# Altium footprint library Connector_Samtec_HLE_THT.PcbLib: 141 footprints (part 6 of 9)
Each footprint in its own frame and in the unit in brackets; x right, y up, seen from the top. Pads: shape width x height; smd on the part's side, far side on the other; paste and mask are expansions set on the pad; w line width, h text height; cw(c..) or ccw(c..) is an arc to the next point about the centre after c.
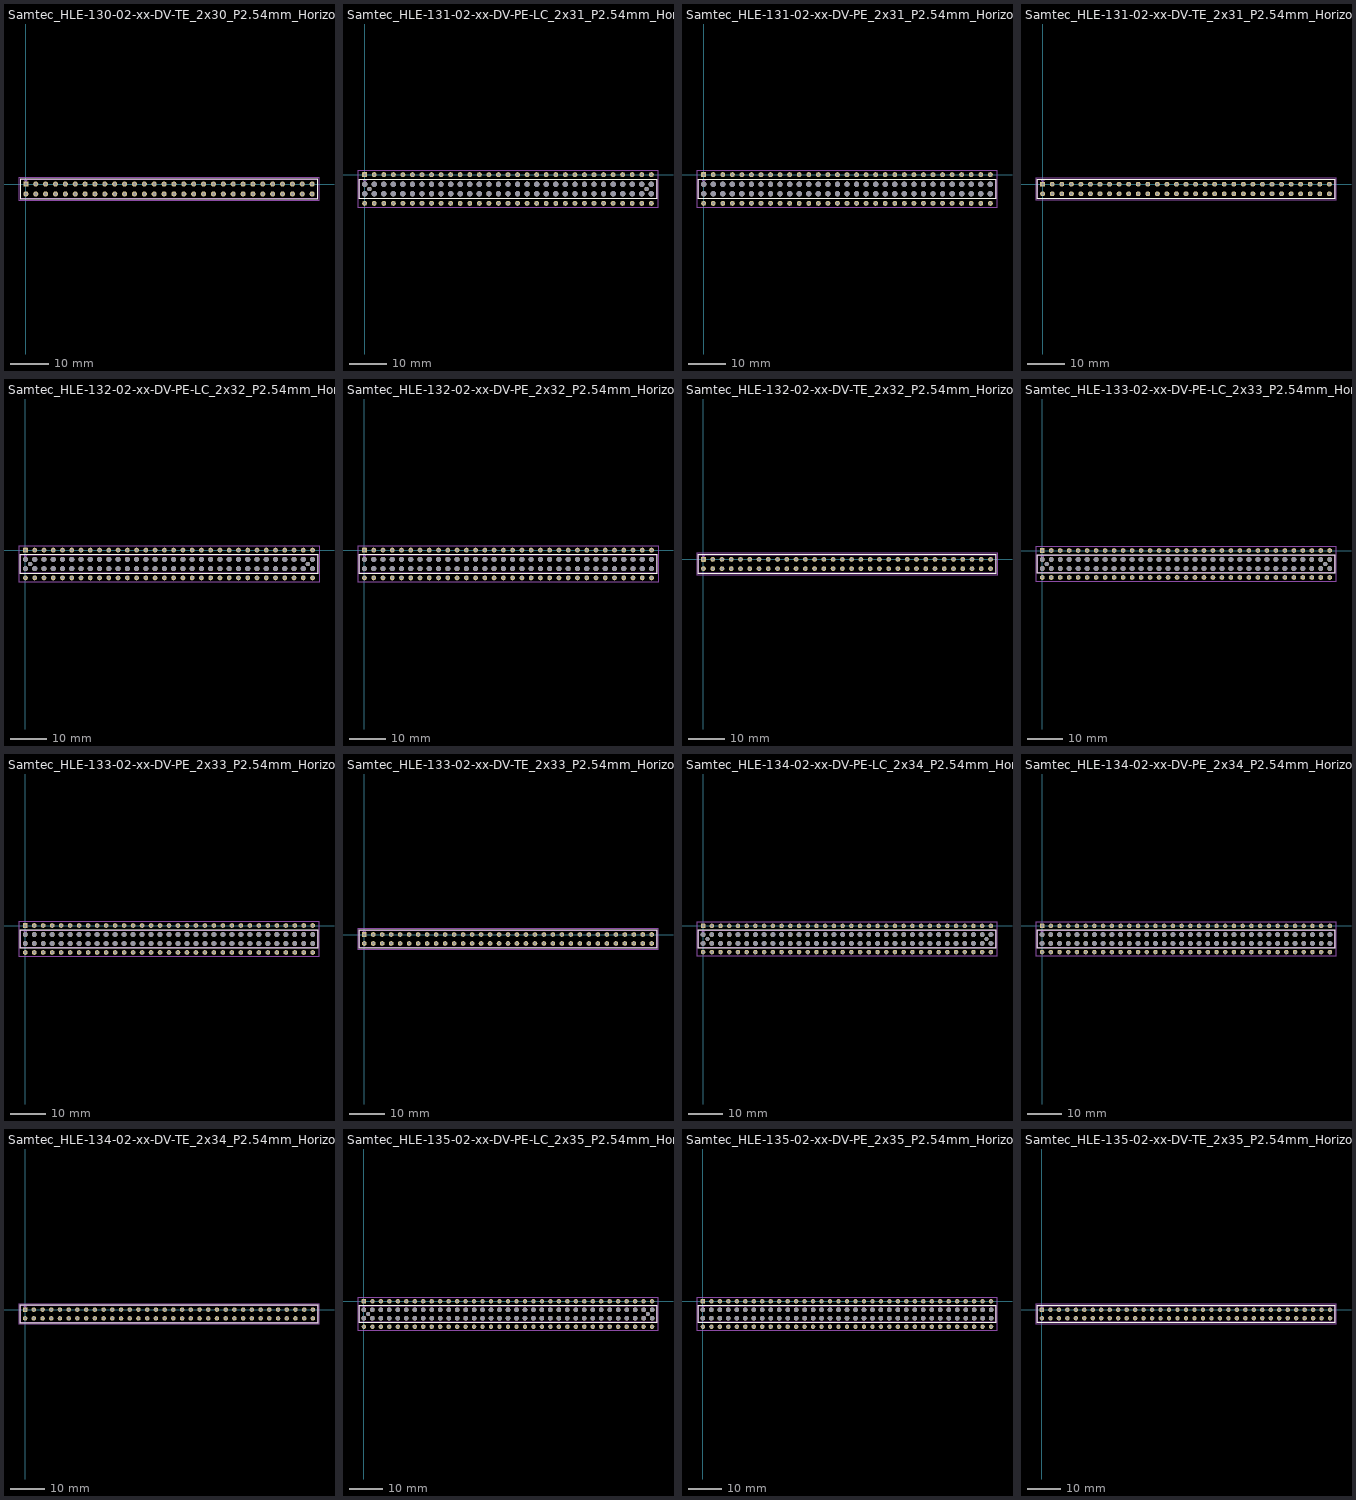
[diagram p5: the footprints below, top view; thin cyan lines are the x and y axes]

## Samtec_HLE-130-02-xx-DV-TE_2x30_P2.54mm_Horizontal [mm]
pads (60):
  rrect19% 1.31x1.31 hole 0.71: 1(0,0)
  round 1.31 hole 0.71: 2(0,-2.54) 3(2.54,0) 4(2.54,-2.54) 5(5.08,0) 6(5.08,-2.54) 7(7.62,0) 8(7.62,-2.54) 9(10.16,0) 10(10.16,-2.54) 11(12.7,0) 12(12.7,-2.54) 13(15.24,0) 14(15.24,-2.54) 15(17.78,0) 16(17.78,-2.54) 17(20.32,0) 18(20.32,-2.54) 19(22.86,0) 20(22.86,-2.54) 21(25.4,0) 22(25.4,-2.54) 23(27.94,0) 24(27.94,-2.54) 25(30.48,0) 26(30.48,-2.54) 27(33.02,0) 28(33.02,-2.54) 29(35.56,0) 30(35.56,-2.54) 31(38.1,0) 32(38.1,-2.54) 33(40.64,0) 34(40.64,-2.54) 35(43.18,0) 36(43.18,-2.54) 37(45.72,0) 38(45.72,-2.54) 39(48.26,0) 40(48.26,-2.54) 41(50.8,0) 42(50.8,-2.54) 43(53.34,0) 44(53.34,-2.54) 45(55.88,0) 46(55.88,-2.54) 47(58.42,0) 48(58.42,-2.54) 49(60.96,0) 50(60.96,-2.54) 51(63.5,0) 52(63.5,-2.54) 53(66.04,0) 54(66.04,-2.54) 55(68.58,0) 56(68.58,-2.54) 57(71.12,0) 58(71.12,-2.54) 59(73.66,0) 60(73.66,-2.54)
F.SilkS:
  lines w0.12: -1.38,-3.92 75.04,-3.92 75.04,1.38 -1.38,1.38 -1.38,-3.92
F.CrtYd:
  lines w0.05: -1.77,-4.31 75.43,-4.31 75.43,1.77 -1.77,1.77 -1.77,-4.31
F.Fab:
  lines w0.1: -0.5,1.27 0,0.563 0.5,1.27 ; -1.27,-3.81 -1.27,1.27 74.93,1.27 74.93,-3.81 -1.27,-3.81
  text "'.Designator'" at 32.783,-3.95 h1

## Samtec_HLE-131-02-xx-DV-PE-LC_2x31_P2.54mm_Horizontal [mm]
pads (126):
  rrect19% 1.31x1.31 hole 0.71: 1(0,0)
  round 1.31 hole 0.71: 2(0,-7.62) 3(2.54,0) 4(2.54,-7.62) 5(5.08,0) 6(5.08,-7.62) 7(7.62,0) 8(7.62,-7.62) 9(10.16,0) 10(10.16,-7.62) 11(12.7,0) 12(12.7,-7.62) 13(15.24,0) 14(15.24,-7.62) 15(17.78,0) 16(17.78,-7.62) 17(20.32,0) 18(20.32,-7.62) 19(22.86,0) 20(22.86,-7.62) 21(25.4,0) 22(25.4,-7.62) 23(27.94,0) 24(27.94,-7.62) 25(30.48,0) 26(30.48,-7.62) 27(33.02,0) 28(33.02,-7.62) 29(35.56,0) 30(35.56,-7.62) 31(38.1,0) 32(38.1,-7.62) 33(40.64,0) 34(40.64,-7.62) 35(43.18,0) 36(43.18,-7.62) 37(45.72,0) 38(45.72,-7.62) 39(48.26,0) 40(48.26,-7.62) 41(50.8,0) 42(50.8,-7.62) 43(53.34,0) 44(53.34,-7.62) 45(55.88,0) 46(55.88,-7.62) 47(58.42,0) 48(58.42,-7.62) 49(60.96,0) 50(60.96,-7.62) 51(63.5,0) 52(63.5,-7.62) 53(66.04,0) 54(66.04,-7.62) 55(68.58,0) 56(68.58,-7.62) 57(71.12,0) 58(71.12,-7.62) 59(73.66,0) 60(73.66,-7.62) 61(76.2,0) 62(76.2,-7.62)
  round 1.4 hole 1.4: Un1(55.88,-5.08) Un2(71.12,-2.54) Un3(12.7,-2.54) Un4(43.18,-2.54) Un5(35.56,-2.54) Un6(15.24,-5.08) Un7(68.58,-5.08) Un8(40.64,-5.08) Un9(17.78,-2.54) Un10(7.62,-5.08) Un11(10.16,-2.54) Un12(30.48,-2.54) Un13(27.94,-2.54) Un14(71.12,-5.08) Un15(50.8,-2.54) Un16(45.72,-2.54) Un17(40.64,-2.54) Un18(2.54,-2.54) Un19(5.08,-5.08) Un21(60.96,-5.08) Un22(73.66,-2.54) Un23(15.24,-2.54) Un24(63.5,-2.54) Un25(43.18,-5.08) Un26(45.72,-5.08) Un27(48.26,-2.54) Un28(76.2,-5.08) Un29(53.34,-5.08) Un30(20.32,-2.54) Un31(50.8,-5.08) Un32(20.32,-5.08) Un33(22.86,-2.54) Un34(55.88,-2.54) Un35(66.04,-2.54) Un36(17.78,-5.08) Un37(73.66,-5.08) Un38(58.42,-5.08) Un39(58.42,-2.54) Un40(66.04,-5.08) Un41(33.02,-2.54) Un42(12.7,-5.08) Un43(35.56,-5.08) Un44(60.96,-2.54) Un45(76.2,-2.54) Un46(68.58,-2.54) Un47(10.16,-5.08) Un48(2.54,-5.08) Un49(0,-2.54) Un50(63.5,-5.08) Un51(25.4,-2.54) Un52(25.4,-5.08) Un53(27.94,-5.08) Un54(30.48,-5.08) Un55(33.02,-5.08) Un56(53.34,-2.54) Un57(0,-5.08) Un58(7.62,-2.54) Un59(5.08,-2.54) Un60(38.1,-5.08) Un62(22.86,-5.08) Un63(38.1,-2.54) Un64(48.26,-5.08)
  round 1.19 hole 1.19: Un20(74.93,-3.81) Un61(1.27,-3.81)
F.SilkS:
  lines w0.12: -1.38,-6.46 -1.38,-1.16 77.58,-1.16 77.58,-6.46 -1.38,-6.46
F.CrtYd:
  lines w0.05: -1.77,-8.78 77.97,-8.78 77.97,1.16 -1.77,1.16 -1.77,-8.78
F.Fab:
  lines w0.1: -0.5,-1.27 0,-1.977 0.5,-1.27 ; -1.27,-6.35 77.47,-6.35 77.47,-1.27 -1.27,-1.27 -1.27,-6.35
  text "'.Designator'" at 34.053,-6.49 h1

## Samtec_HLE-131-02-xx-DV-PE_2x31_P2.54mm_Horizontal [mm]
pads (124):
  rrect19% 1.31x1.31 hole 0.71: 1(0,0)
  round 1.31 hole 0.71: 2(0,-7.62) 3(2.54,0) 4(2.54,-7.62) 5(5.08,0) 6(5.08,-7.62) 7(7.62,0) 8(7.62,-7.62) 9(10.16,0) 10(10.16,-7.62) 11(12.7,0) 12(12.7,-7.62) 13(15.24,0) 14(15.24,-7.62) 15(17.78,0) 16(17.78,-7.62) 17(20.32,0) 18(20.32,-7.62) 19(22.86,0) 20(22.86,-7.62) 21(25.4,0) 22(25.4,-7.62) 23(27.94,0) 24(27.94,-7.62) 25(30.48,0) 26(30.48,-7.62) 27(33.02,0) 28(33.02,-7.62) 29(35.56,0) 30(35.56,-7.62) 31(38.1,0) 32(38.1,-7.62) 33(40.64,0) 34(40.64,-7.62) 35(43.18,0) 36(43.18,-7.62) 37(45.72,0) 38(45.72,-7.62) 39(48.26,0) 40(48.26,-7.62) 41(50.8,0) 42(50.8,-7.62) 43(53.34,0) 44(53.34,-7.62) 45(55.88,0) 46(55.88,-7.62) 47(58.42,0) 48(58.42,-7.62) 49(60.96,0) 50(60.96,-7.62) 51(63.5,0) 52(63.5,-7.62) 53(66.04,0) 54(66.04,-7.62) 55(68.58,0) 56(68.58,-7.62) 57(71.12,0) 58(71.12,-7.62) 59(73.66,0) 60(73.66,-7.62) 61(76.2,0) 62(76.2,-7.62)
  round 1.4 hole 1.4: Un1(5.08,-2.54) Un2(60.96,-5.08) Un3(17.78,-2.54) Un4(48.26,-5.08) Un5(20.32,-2.54) Un6(27.94,-5.08) Un7(63.5,-5.08) Un8(15.24,-2.54) Un9(50.8,-5.08) Un10(15.24,-5.08) Un11(71.12,-2.54) Un12(76.2,-5.08) Un13(33.02,-2.54) Un14(33.02,-5.08) Un15(58.42,-2.54) Un16(66.04,-2.54) Un17(38.1,-2.54) Un18(73.66,-5.08) Un19(0,-5.08) Un20(10.16,-2.54) Un21(58.42,-5.08) Un22(50.8,-2.54) Un23(71.12,-5.08) Un24(53.34,-5.08) Un25(55.88,-5.08) Un26(43.18,-5.08) Un27(38.1,-5.08) Un28(63.5,-2.54) Un29(10.16,-5.08) Un30(60.96,-2.54) Un31(30.48,-2.54) Un32(48.26,-2.54) Un33(22.86,-5.08) Un34(20.32,-5.08) Un35(68.58,-2.54) Un36(66.04,-5.08) Un37(45.72,-2.54) Un38(76.2,-2.54) Un39(12.7,-2.54) Un40(25.4,-5.08) Un41(73.66,-2.54) Un42(40.64,-2.54) Un43(12.7,-5.08) Un44(27.94,-2.54) Un45(35.56,-5.08) Un46(2.54,-5.08) Un47(7.62,-5.08) Un48(45.72,-5.08) Un49(43.18,-2.54) Un50(17.78,-5.08) Un51(22.86,-2.54) Un52(53.34,-2.54) Un53(25.4,-2.54) Un54(5.08,-5.08) Un55(55.88,-2.54) Un56(30.48,-5.08) Un57(35.56,-2.54) Un58(2.54,-2.54) Un59(40.64,-5.08) Un60(68.58,-5.08) Un61(7.62,-2.54) Un62(0,-2.54)
F.SilkS:
  lines w0.12: -1.38,-6.46 -1.38,-1.16 77.58,-1.16 77.58,-6.46 -1.38,-6.46
F.CrtYd:
  lines w0.05: -1.77,-8.78 -1.77,1.16 77.97,1.16 77.97,-8.78 -1.77,-8.78
F.Fab:
  lines w0.1: -0.5,-1.27 0,-1.977 0.5,-1.27 ; -1.27,-6.35 77.47,-6.35 77.47,-1.27 -1.27,-1.27 -1.27,-6.35
  text "'.Designator'" at 34.053,-6.49 h1

## Samtec_HLE-131-02-xx-DV-TE_2x31_P2.54mm_Horizontal [mm]
pads (62):
  rrect19% 1.31x1.31 hole 0.71: 1(0,0)
  round 1.31 hole 0.71: 2(0,-2.54) 3(2.54,0) 4(2.54,-2.54) 5(5.08,0) 6(5.08,-2.54) 7(7.62,0) 8(7.62,-2.54) 9(10.16,0) 10(10.16,-2.54) 11(12.7,0) 12(12.7,-2.54) 13(15.24,0) 14(15.24,-2.54) 15(17.78,0) 16(17.78,-2.54) 17(20.32,0) 18(20.32,-2.54) 19(22.86,0) 20(22.86,-2.54) 21(25.4,0) 22(25.4,-2.54) 23(27.94,0) 24(27.94,-2.54) 25(30.48,0) 26(30.48,-2.54) 27(33.02,0) 28(33.02,-2.54) 29(35.56,0) 30(35.56,-2.54) 31(38.1,0) 32(38.1,-2.54) 33(40.64,0) 34(40.64,-2.54) 35(43.18,0) 36(43.18,-2.54) 37(45.72,0) 38(45.72,-2.54) 39(48.26,0) 40(48.26,-2.54) 41(50.8,0) 42(50.8,-2.54) 43(53.34,0) 44(53.34,-2.54) 45(55.88,0) 46(55.88,-2.54) 47(58.42,0) 48(58.42,-2.54) 49(60.96,0) 50(60.96,-2.54) 51(63.5,0) 52(63.5,-2.54) 53(66.04,0) 54(66.04,-2.54) 55(68.58,0) 56(68.58,-2.54) 57(71.12,0) 58(71.12,-2.54) 59(73.66,0) 60(73.66,-2.54) 61(76.2,0) 62(76.2,-2.54)
F.SilkS:
  lines w0.12: -1.38,-3.92 -1.38,1.38 77.58,1.38 77.58,-3.92 -1.38,-3.92
F.CrtYd:
  lines w0.05: -1.77,-4.31 77.97,-4.31 77.97,1.77 -1.77,1.77 -1.77,-4.31
F.Fab:
  lines w0.1: -0.5,1.27 0,0.563 0.5,1.27 ; -1.27,-3.81 77.47,-3.81 77.47,1.27 -1.27,1.27 -1.27,-3.81
  text "'.Designator'" at 34.053,-3.95 h1

## Samtec_HLE-132-02-xx-DV-PE-LC_2x32_P2.54mm_Horizontal [mm]
pads (130):
  rrect19% 1.31x1.31 hole 0.71: 1(0,0)
  round 1.31 hole 0.71: 2(0,-7.62) 3(2.54,0) 4(2.54,-7.62) 5(5.08,0) 6(5.08,-7.62) 7(7.62,0) 8(7.62,-7.62) 9(10.16,0) 10(10.16,-7.62) 11(12.7,0) 12(12.7,-7.62) 13(15.24,0) 14(15.24,-7.62) 15(17.78,0) 16(17.78,-7.62) 17(20.32,0) 18(20.32,-7.62) 19(22.86,0) 20(22.86,-7.62) 21(25.4,0) 22(25.4,-7.62) 23(27.94,0) 24(27.94,-7.62) 25(30.48,0) 26(30.48,-7.62) 27(33.02,0) 28(33.02,-7.62) 29(35.56,0) 30(35.56,-7.62) 31(38.1,0) 32(38.1,-7.62) 33(40.64,0) 34(40.64,-7.62) 35(43.18,0) 36(43.18,-7.62) 37(45.72,0) 38(45.72,-7.62) 39(48.26,0) 40(48.26,-7.62) 41(50.8,0) 42(50.8,-7.62) 43(53.34,0) 44(53.34,-7.62) 45(55.88,0) 46(55.88,-7.62) 47(58.42,0) 48(58.42,-7.62) 49(60.96,0) 50(60.96,-7.62) 51(63.5,0) 52(63.5,-7.62) 53(66.04,0) 54(66.04,-7.62) 55(68.58,0) 56(68.58,-7.62) 57(71.12,0) 58(71.12,-7.62) 59(73.66,0) 60(73.66,-7.62) 61(76.2,0) 62(76.2,-7.62) 63(78.74,0) 64(78.74,-7.62)
  round 1.4 hole 1.4: Un1(45.72,-5.08) Un2(10.16,-2.54) Un3(2.54,-5.08) Un4(30.48,-5.08) Un5(78.74,-2.54) Un6(66.04,-2.54) Un8(63.5,-2.54) Un9(35.56,-2.54) Un10(55.88,-2.54) Un11(38.1,-2.54) Un12(40.64,-2.54) Un13(5.08,-5.08) Un14(0,-2.54) Un15(25.4,-5.08) Un16(50.8,-5.08) Un17(20.32,-2.54) Un18(12.7,-2.54) Un19(55.88,-5.08) Un20(76.2,-5.08) Un21(48.26,-5.08) Un22(73.66,-5.08) Un23(15.24,-5.08) Un24(43.18,-5.08) Un25(25.4,-2.54) Un26(33.02,-5.08) Un27(43.18,-2.54) Un28(5.08,-2.54) Un29(17.78,-2.54) Un30(63.5,-5.08) Un31(33.02,-2.54) Un32(15.24,-2.54) Un33(58.42,-2.54) Un34(60.96,-5.08) Un35(2.54,-2.54) Un36(48.26,-2.54) Un37(22.86,-2.54) Un38(50.8,-2.54) Un40(60.96,-2.54) Un41(12.7,-5.08) Un42(7.62,-5.08) Un43(27.94,-2.54) Un44(22.86,-5.08) Un45(0,-5.08) Un46(53.34,-5.08) Un47(45.72,-2.54) Un48(53.34,-2.54) Un49(20.32,-5.08) Un50(71.12,-5.08) Un51(40.64,-5.08) Un52(71.12,-2.54) Un53(76.2,-2.54) Un54(35.56,-5.08) Un55(58.42,-5.08) Un56(68.58,-2.54) Un57(27.94,-5.08) Un58(68.58,-5.08) Un59(10.16,-5.08) Un60(17.78,-5.08) Un61(78.74,-5.08) Un62(38.1,-5.08) Un63(7.62,-2.54) Un64(73.66,-2.54) Un65(30.48,-2.54) Un66(66.04,-5.08)
  round 1.19 hole 1.19: Un7(1.27,-3.81) Un39(77.47,-3.81)
F.SilkS:
  lines w0.12: -1.38,-6.46 80.12,-6.46 80.12,-1.16 -1.38,-1.16 -1.38,-6.46
F.CrtYd:
  lines w0.05: -1.77,-8.78 -1.77,1.16 80.51,1.16 80.51,-8.78 -1.77,-8.78
F.Fab:
  lines w0.1: -0.5,-1.27 0,-1.977 0.5,-1.27 ; -1.27,-6.35 80.01,-6.35 80.01,-1.27 -1.27,-1.27 -1.27,-6.35
  text "'.Designator'" at 35.323,-6.49 h1

## Samtec_HLE-132-02-xx-DV-PE_2x32_P2.54mm_Horizontal [mm]
pads (128):
  rrect19% 1.31x1.31 hole 0.71: 1(0,0)
  round 1.31 hole 0.71: 2(0,-7.62) 3(2.54,0) 4(2.54,-7.62) 5(5.08,0) 6(5.08,-7.62) 7(7.62,0) 8(7.62,-7.62) 9(10.16,0) 10(10.16,-7.62) 11(12.7,0) 12(12.7,-7.62) 13(15.24,0) 14(15.24,-7.62) 15(17.78,0) 16(17.78,-7.62) 17(20.32,0) 18(20.32,-7.62) 19(22.86,0) 20(22.86,-7.62) 21(25.4,0) 22(25.4,-7.62) 23(27.94,0) 24(27.94,-7.62) 25(30.48,0) 26(30.48,-7.62) 27(33.02,0) 28(33.02,-7.62) 29(35.56,0) 30(35.56,-7.62) 31(38.1,0) 32(38.1,-7.62) 33(40.64,0) 34(40.64,-7.62) 35(43.18,0) 36(43.18,-7.62) 37(45.72,0) 38(45.72,-7.62) 39(48.26,0) 40(48.26,-7.62) 41(50.8,0) 42(50.8,-7.62) 43(53.34,0) 44(53.34,-7.62) 45(55.88,0) 46(55.88,-7.62) 47(58.42,0) 48(58.42,-7.62) 49(60.96,0) 50(60.96,-7.62) 51(63.5,0) 52(63.5,-7.62) 53(66.04,0) 54(66.04,-7.62) 55(68.58,0) 56(68.58,-7.62) 57(71.12,0) 58(71.12,-7.62) 59(73.66,0) 60(73.66,-7.62) 61(76.2,0) 62(76.2,-7.62) 63(78.74,0) 64(78.74,-7.62)
  round 1.4 hole 1.4: Un1(48.26,-5.08) Un2(60.96,-2.54) Un3(5.08,-5.08) Un4(63.5,-5.08) Un5(71.12,-5.08) Un6(0,-5.08) Un7(2.54,-2.54) Un8(12.7,-2.54) Un9(40.64,-5.08) Un10(22.86,-5.08) Un11(63.5,-2.54) Un12(10.16,-2.54) Un13(71.12,-2.54) Un14(48.26,-2.54) Un15(33.02,-5.08) Un16(25.4,-5.08) Un17(15.24,-5.08) Un18(0,-2.54) Un19(33.02,-2.54) Un20(58.42,-5.08) Un21(55.88,-2.54) Un22(66.04,-2.54) Un23(76.2,-5.08) Un24(45.72,-2.54) Un25(68.58,-5.08) Un26(30.48,-2.54) Un27(17.78,-5.08) Un28(30.48,-5.08) Un29(50.8,-5.08) Un30(76.2,-2.54) Un31(7.62,-2.54) Un32(60.96,-5.08) Un33(53.34,-2.54) Un34(53.34,-5.08) Un35(66.04,-5.08) Un36(10.16,-5.08) Un37(38.1,-2.54) Un38(22.86,-2.54) Un39(43.18,-2.54) Un40(2.54,-5.08) Un41(38.1,-5.08) Un42(78.74,-5.08) Un43(20.32,-5.08) Un44(50.8,-2.54) Un45(78.74,-2.54) Un46(40.64,-2.54) Un47(15.24,-2.54) Un48(58.42,-2.54) Un49(35.56,-5.08) Un50(7.62,-5.08) Un51(12.7,-5.08) Un52(20.32,-2.54) Un53(73.66,-5.08) Un54(68.58,-2.54) Un55(35.56,-2.54) Un56(25.4,-2.54) Un57(73.66,-2.54) Un58(43.18,-5.08) Un59(27.94,-2.54) Un60(55.88,-5.08) Un61(5.08,-2.54) Un62(45.72,-5.08) Un63(17.78,-2.54) Un64(27.94,-5.08)
F.SilkS:
  lines w0.12: -1.38,-6.46 80.12,-6.46 80.12,-1.16 -1.38,-1.16 -1.38,-6.46
F.CrtYd:
  lines w0.05: -1.77,-8.78 80.51,-8.78 80.51,1.16 -1.77,1.16 -1.77,-8.78
F.Fab:
  lines w0.1: -0.5,-1.27 0,-1.977 0.5,-1.27 ; -1.27,-6.35 80.01,-6.35 80.01,-1.27 -1.27,-1.27 -1.27,-6.35
  text "'.Designator'" at 35.323,-6.49 h1

## Samtec_HLE-132-02-xx-DV-TE_2x32_P2.54mm_Horizontal [mm]
pads (64):
  rrect19% 1.31x1.31 hole 0.71: 1(0,0)
  round 1.31 hole 0.71: 2(0,-2.54) 3(2.54,0) 4(2.54,-2.54) 5(5.08,0) 6(5.08,-2.54) 7(7.62,0) 8(7.62,-2.54) 9(10.16,0) 10(10.16,-2.54) 11(12.7,0) 12(12.7,-2.54) 13(15.24,0) 14(15.24,-2.54) 15(17.78,0) 16(17.78,-2.54) 17(20.32,0) 18(20.32,-2.54) 19(22.86,0) 20(22.86,-2.54) 21(25.4,0) 22(25.4,-2.54) 23(27.94,0) 24(27.94,-2.54) 25(30.48,0) 26(30.48,-2.54) 27(33.02,0) 28(33.02,-2.54) 29(35.56,0) 30(35.56,-2.54) 31(38.1,0) 32(38.1,-2.54) 33(40.64,0) 34(40.64,-2.54) 35(43.18,0) 36(43.18,-2.54) 37(45.72,0) 38(45.72,-2.54) 39(48.26,0) 40(48.26,-2.54) 41(50.8,0) 42(50.8,-2.54) 43(53.34,0) 44(53.34,-2.54) 45(55.88,0) 46(55.88,-2.54) 47(58.42,0) 48(58.42,-2.54) 49(60.96,0) 50(60.96,-2.54) 51(63.5,0) 52(63.5,-2.54) 53(66.04,0) 54(66.04,-2.54) 55(68.58,0) 56(68.58,-2.54) 57(71.12,0) 58(71.12,-2.54) 59(73.66,0) 60(73.66,-2.54) 61(76.2,0) 62(76.2,-2.54) 63(78.74,0) 64(78.74,-2.54)
F.SilkS:
  lines w0.12: -1.38,-3.92 80.12,-3.92 80.12,1.38 -1.38,1.38 -1.38,-3.92
F.CrtYd:
  lines w0.05: -1.77,-4.31 -1.77,1.77 80.51,1.77 80.51,-4.31 -1.77,-4.31
F.Fab:
  lines w0.1: -0.5,1.27 0,0.563 0.5,1.27 ; -1.27,-3.81 80.01,-3.81 80.01,1.27 -1.27,1.27 -1.27,-3.81
  text "'.Designator'" at 35.323,-3.95 h1

## Samtec_HLE-133-02-xx-DV-PE-LC_2x33_P2.54mm_Horizontal [mm]
pads (134):
  rrect19% 1.31x1.31 hole 0.71: 1(0,0)
  round 1.31 hole 0.71: 2(0,-7.62) 3(2.54,0) 4(2.54,-7.62) 5(5.08,0) 6(5.08,-7.62) 7(7.62,0) 8(7.62,-7.62) 9(10.16,0) 10(10.16,-7.62) 11(12.7,0) 12(12.7,-7.62) 13(15.24,0) 14(15.24,-7.62) 15(17.78,0) 16(17.78,-7.62) 17(20.32,0) 18(20.32,-7.62) 19(22.86,0) 20(22.86,-7.62) 21(25.4,0) 22(25.4,-7.62) 23(27.94,0) 24(27.94,-7.62) 25(30.48,0) 26(30.48,-7.62) 27(33.02,0) 28(33.02,-7.62) 29(35.56,0) 30(35.56,-7.62) 31(38.1,0) 32(38.1,-7.62) 33(40.64,0) 34(40.64,-7.62) 35(43.18,0) 36(43.18,-7.62) 37(45.72,0) 38(45.72,-7.62) 39(48.26,0) 40(48.26,-7.62) 41(50.8,0) 42(50.8,-7.62) 43(53.34,0) 44(53.34,-7.62) 45(55.88,0) 46(55.88,-7.62) 47(58.42,0) 48(58.42,-7.62) 49(60.96,0) 50(60.96,-7.62) 51(63.5,0) 52(63.5,-7.62) 53(66.04,0) 54(66.04,-7.62) 55(68.58,0) 56(68.58,-7.62) 57(71.12,0) 58(71.12,-7.62) 59(73.66,0) 60(73.66,-7.62) 61(76.2,0) 62(76.2,-7.62) 63(78.74,0) 64(78.74,-7.62) 65(81.28,0) 66(81.28,-7.62)
  round 1.4 hole 1.4: Un1(73.66,-2.54) Un2(63.5,-2.54) Un3(43.18,-5.08) Un4(68.58,-2.54) Un5(40.64,-2.54) Un6(20.32,-5.08) Un7(68.58,-5.08) Un8(58.42,-5.08) Un9(35.56,-2.54) Un10(63.5,-5.08) Un11(7.62,-2.54) Un12(10.16,-5.08) Un13(53.34,-5.08) Un14(53.34,-2.54) Un15(7.62,-5.08) Un16(50.8,-5.08) Un17(25.4,-5.08) Un18(71.12,-5.08) Un19(15.24,-5.08) Un20(33.02,-2.54) Un21(30.48,-2.54) Un23(20.32,-2.54) Un24(17.78,-5.08) Un25(71.12,-2.54) Un26(5.08,-5.08) Un27(73.66,-5.08) Un28(5.08,-2.54) Un29(81.28,-5.08) Un30(27.94,-2.54) Un31(81.28,-2.54) Un32(33.02,-5.08) Un33(35.56,-5.08) Un34(0,-2.54) Un35(12.7,-5.08) Un36(55.88,-5.08) Un37(17.78,-2.54) Un38(78.74,-5.08) Un39(27.94,-5.08) Un40(60.96,-2.54) Un41(76.2,-2.54) Un42(12.7,-2.54) Un43(60.96,-5.08) Un44(50.8,-2.54) Un45(55.88,-2.54) Un46(45.72,-2.54) Un48(15.24,-2.54) Un49(66.04,-2.54) Un50(2.54,-2.54) Un51(40.64,-5.08) Un52(30.48,-5.08) Un53(48.26,-5.08) Un54(25.4,-2.54) Un55(38.1,-5.08) Un56(58.42,-2.54) Un57(10.16,-2.54) Un58(45.72,-5.08) Un59(0,-5.08) Un60(2.54,-5.08) Un61(48.26,-2.54) Un62(38.1,-2.54) Un63(22.86,-2.54) Un64(78.74,-2.54) Un65(22.86,-5.08) Un66(66.04,-5.08) Un67(76.2,-5.08) Un68(43.18,-2.54)
  round 1.19 hole 1.19: Un22(80.01,-3.81) Un47(1.27,-3.81)
F.SilkS:
  lines w0.12: -1.38,-6.46 82.66,-6.46 82.66,-1.16 -1.38,-1.16 -1.38,-6.46
F.CrtYd:
  lines w0.05: -1.77,-8.78 83.05,-8.78 83.05,1.16 -1.77,1.16 -1.77,-8.78
F.Fab:
  lines w0.1: -0.5,-1.27 0,-1.977 0.5,-1.27 ; -1.27,-6.35 82.55,-6.35 82.55,-1.27 -1.27,-1.27 -1.27,-6.35
  text "'.Designator'" at 36.593,-6.49 h1

## Samtec_HLE-133-02-xx-DV-PE_2x33_P2.54mm_Horizontal [mm]
pads (132):
  rrect19% 1.31x1.31 hole 0.71: 1(0,0)
  round 1.31 hole 0.71: 2(0,-7.62) 3(2.54,0) 4(2.54,-7.62) 5(5.08,0) 6(5.08,-7.62) 7(7.62,0) 8(7.62,-7.62) 9(10.16,0) 10(10.16,-7.62) 11(12.7,0) 12(12.7,-7.62) 13(15.24,0) 14(15.24,-7.62) 15(17.78,0) 16(17.78,-7.62) 17(20.32,0) 18(20.32,-7.62) 19(22.86,0) 20(22.86,-7.62) 21(25.4,0) 22(25.4,-7.62) 23(27.94,0) 24(27.94,-7.62) 25(30.48,0) 26(30.48,-7.62) 27(33.02,0) 28(33.02,-7.62) 29(35.56,0) 30(35.56,-7.62) 31(38.1,0) 32(38.1,-7.62) 33(40.64,0) 34(40.64,-7.62) 35(43.18,0) 36(43.18,-7.62) 37(45.72,0) 38(45.72,-7.62) 39(48.26,0) 40(48.26,-7.62) 41(50.8,0) 42(50.8,-7.62) 43(53.34,0) 44(53.34,-7.62) 45(55.88,0) 46(55.88,-7.62) 47(58.42,0) 48(58.42,-7.62) 49(60.96,0) 50(60.96,-7.62) 51(63.5,0) 52(63.5,-7.62) 53(66.04,0) 54(66.04,-7.62) 55(68.58,0) 56(68.58,-7.62) 57(71.12,0) 58(71.12,-7.62) 59(73.66,0) 60(73.66,-7.62) 61(76.2,0) 62(76.2,-7.62) 63(78.74,0) 64(78.74,-7.62) 65(81.28,0) 66(81.28,-7.62)
  round 1.4 hole 1.4: Un1(68.58,-5.08) Un2(76.2,-2.54) Un3(38.1,-5.08) Un4(55.88,-5.08) Un5(71.12,-5.08) Un6(55.88,-2.54) Un7(50.8,-2.54) Un8(0,-2.54) Un9(30.48,-2.54) Un10(0,-5.08) Un11(66.04,-5.08) Un12(48.26,-5.08) Un13(20.32,-2.54) Un14(12.7,-2.54) Un15(35.56,-2.54) Un16(73.66,-5.08) Un17(53.34,-2.54) Un18(48.26,-2.54) Un19(25.4,-5.08) Un20(20.32,-5.08) Un21(27.94,-5.08) Un22(58.42,-2.54) Un23(15.24,-5.08) Un24(43.18,-2.54) Un25(17.78,-5.08) Un26(60.96,-5.08) Un27(71.12,-2.54) Un28(66.04,-2.54) Un29(33.02,-2.54) Un30(53.34,-5.08) Un31(81.28,-2.54) Un32(40.64,-2.54) Un33(81.28,-5.08) Un34(27.94,-2.54) Un35(7.62,-5.08) Un36(63.5,-5.08) Un37(17.78,-2.54) Un38(68.58,-2.54) Un39(30.48,-5.08) Un40(12.7,-5.08) Un41(35.56,-5.08) Un42(7.62,-2.54) Un43(38.1,-2.54) Un44(22.86,-5.08) Un45(40.64,-5.08) Un46(2.54,-2.54) Un47(43.18,-5.08) Un48(10.16,-2.54) Un49(73.66,-2.54) Un50(33.02,-5.08) Un51(22.86,-2.54) Un52(45.72,-5.08) Un53(78.74,-5.08) Un54(78.74,-2.54) Un55(60.96,-2.54) Un56(5.08,-2.54) Un57(58.42,-5.08) Un58(45.72,-2.54) Un59(10.16,-5.08) Un60(15.24,-2.54) Un61(25.4,-2.54) Un62(63.5,-2.54) Un63(76.2,-5.08) Un64(5.08,-5.08) Un65(2.54,-5.08) Un66(50.8,-5.08)
F.SilkS:
  lines w0.12: -1.38,-6.46 -1.38,-1.16 82.66,-1.16 82.66,-6.46 -1.38,-6.46
F.CrtYd:
  lines w0.05: -1.77,-8.78 -1.77,1.16 83.05,1.16 83.05,-8.78 -1.77,-8.78
F.Fab:
  lines w0.1: -0.5,-1.27 0,-1.977 0.5,-1.27 ; -1.27,-6.35 -1.27,-1.27 82.55,-1.27 82.55,-6.35 -1.27,-6.35
  text "'.Designator'" at 36.593,-6.49 h1

## Samtec_HLE-133-02-xx-DV-TE_2x33_P2.54mm_Horizontal [mm]
pads (66):
  rrect19% 1.31x1.31 hole 0.71: 1(0,0)
  round 1.31 hole 0.71: 2(0,-2.54) 3(2.54,0) 4(2.54,-2.54) 5(5.08,0) 6(5.08,-2.54) 7(7.62,0) 8(7.62,-2.54) 9(10.16,0) 10(10.16,-2.54) 11(12.7,0) 12(12.7,-2.54) 13(15.24,0) 14(15.24,-2.54) 15(17.78,0) 16(17.78,-2.54) 17(20.32,0) 18(20.32,-2.54) 19(22.86,0) 20(22.86,-2.54) 21(25.4,0) 22(25.4,-2.54) 23(27.94,0) 24(27.94,-2.54) 25(30.48,0) 26(30.48,-2.54) 27(33.02,0) 28(33.02,-2.54) 29(35.56,0) 30(35.56,-2.54) 31(38.1,0) 32(38.1,-2.54) 33(40.64,0) 34(40.64,-2.54) 35(43.18,0) 36(43.18,-2.54) 37(45.72,0) 38(45.72,-2.54) 39(48.26,0) 40(48.26,-2.54) 41(50.8,0) 42(50.8,-2.54) 43(53.34,0) 44(53.34,-2.54) 45(55.88,0) 46(55.88,-2.54) 47(58.42,0) 48(58.42,-2.54) 49(60.96,0) 50(60.96,-2.54) 51(63.5,0) 52(63.5,-2.54) 53(66.04,0) 54(66.04,-2.54) 55(68.58,0) 56(68.58,-2.54) 57(71.12,0) 58(71.12,-2.54) 59(73.66,0) 60(73.66,-2.54) 61(76.2,0) 62(76.2,-2.54) 63(78.74,0) 64(78.74,-2.54) 65(81.28,0) 66(81.28,-2.54)
F.SilkS:
  lines w0.12: -1.38,-3.92 82.66,-3.92 82.66,1.38 -1.38,1.38 -1.38,-3.92
F.CrtYd:
  lines w0.05: -1.77,-4.31 83.05,-4.31 83.05,1.77 -1.77,1.77 -1.77,-4.31
F.Fab:
  lines w0.1: -0.5,1.27 0,0.563 0.5,1.27 ; -1.27,-3.81 -1.27,1.27 82.55,1.27 82.55,-3.81 -1.27,-3.81
  text "'.Designator'" at 36.593,-3.95 h1

## Samtec_HLE-134-02-xx-DV-PE-LC_2x34_P2.54mm_Horizontal [mm]
pads (138):
  rrect19% 1.31x1.31 hole 0.71: 1(0,0)
  round 1.31 hole 0.71: 2(0,-7.62) 3(2.54,0) 4(2.54,-7.62) 5(5.08,0) 6(5.08,-7.62) 7(7.62,0) 8(7.62,-7.62) 9(10.16,0) 10(10.16,-7.62) 11(12.7,0) 12(12.7,-7.62) 13(15.24,0) 14(15.24,-7.62) 15(17.78,0) 16(17.78,-7.62) 17(20.32,0) 18(20.32,-7.62) 19(22.86,0) 20(22.86,-7.62) 21(25.4,0) 22(25.4,-7.62) 23(27.94,0) 24(27.94,-7.62) 25(30.48,0) 26(30.48,-7.62) 27(33.02,0) 28(33.02,-7.62) 29(35.56,0) 30(35.56,-7.62) 31(38.1,0) 32(38.1,-7.62) 33(40.64,0) 34(40.64,-7.62) 35(43.18,0) 36(43.18,-7.62) 37(45.72,0) 38(45.72,-7.62) 39(48.26,0) 40(48.26,-7.62) 41(50.8,0) 42(50.8,-7.62) 43(53.34,0) 44(53.34,-7.62) 45(55.88,0) 46(55.88,-7.62) 47(58.42,0) 48(58.42,-7.62) 49(60.96,0) 50(60.96,-7.62) 51(63.5,0) 52(63.5,-7.62) 53(66.04,0) 54(66.04,-7.62) 55(68.58,0) 56(68.58,-7.62) 57(71.12,0) 58(71.12,-7.62) 59(73.66,0) 60(73.66,-7.62) 61(76.2,0) 62(76.2,-7.62) 63(78.74,0) 64(78.74,-7.62) 65(81.28,0) 66(81.28,-7.62) 67(83.82,0) 68(83.82,-7.62)
  round 1.4 hole 1.4: Un1(20.32,-5.08) Un2(50.8,-2.54) Un3(7.62,-5.08) Un4(2.54,-2.54) Un5(76.2,-5.08) Un6(7.62,-2.54) Un7(15.24,-5.08) Un8(83.82,-5.08) Un9(66.04,-5.08) Un10(55.88,-2.54) Un11(30.48,-2.54) Un12(45.72,-5.08) Un13(30.48,-5.08) Un14(17.78,-2.54) Un15(12.7,-5.08) Un16(63.5,-5.08) Un17(17.78,-5.08) Un18(10.16,-5.08) Un19(78.74,-5.08) Un20(50.8,-5.08) Un22(38.1,-2.54) Un23(53.34,-5.08) Un24(83.82,-2.54) Un25(71.12,-2.54) Un26(25.4,-2.54) Un27(38.1,-5.08) Un28(53.34,-2.54) Un29(81.28,-5.08) Un30(12.7,-2.54) Un31(22.86,-5.08) Un32(58.42,-5.08) Un33(27.94,-2.54) Un34(40.64,-5.08) Un35(48.26,-2.54) Un36(63.5,-2.54) Un37(0,-5.08) Un38(60.96,-2.54) Un39(27.94,-5.08) Un40(58.42,-2.54) Un41(71.12,-5.08) Un42(15.24,-2.54) Un43(76.2,-2.54) Un44(2.54,-5.08) Un45(55.88,-5.08) Un46(22.86,-2.54) Un48(48.26,-5.08) Un49(66.04,-2.54) Un50(68.58,-2.54) Un51(68.58,-5.08) Un52(73.66,-5.08) Un53(78.74,-2.54) Un54(5.08,-2.54) Un55(45.72,-2.54) Un56(43.18,-5.08) Un57(73.66,-2.54) Un58(35.56,-2.54) Un59(40.64,-2.54) Un60(25.4,-5.08) Un61(81.28,-2.54) Un62(35.56,-5.08) Un63(10.16,-2.54) Un64(60.96,-5.08) Un65(33.02,-2.54) Un66(43.18,-2.54) Un67(5.08,-5.08) Un68(20.32,-2.54) Un69(33.02,-5.08) Un70(0,-2.54)
  round 1.19 hole 1.19: Un21(82.55,-3.81) Un47(1.27,-3.81)
F.SilkS:
  lines w0.12: -1.38,-6.46 -1.38,-1.16 85.2,-1.16 85.2,-6.46 -1.38,-6.46
F.CrtYd:
  lines w0.05: -1.77,-8.78 85.59,-8.78 85.59,1.16 -1.77,1.16 -1.77,-8.78
F.Fab:
  lines w0.1: -0.5,-1.27 0,-1.977 0.5,-1.27 ; -1.27,-6.35 -1.27,-1.27 85.09,-1.27 85.09,-6.35 -1.27,-6.35
  text "'.Designator'" at 37.863,-6.49 h1

## Samtec_HLE-134-02-xx-DV-PE_2x34_P2.54mm_Horizontal [mm]
pads (136):
  rrect19% 1.31x1.31 hole 0.71: 1(0,0)
  round 1.31 hole 0.71: 2(0,-7.62) 3(2.54,0) 4(2.54,-7.62) 5(5.08,0) 6(5.08,-7.62) 7(7.62,0) 8(7.62,-7.62) 9(10.16,0) 10(10.16,-7.62) 11(12.7,0) 12(12.7,-7.62) 13(15.24,0) 14(15.24,-7.62) 15(17.78,0) 16(17.78,-7.62) 17(20.32,0) 18(20.32,-7.62) 19(22.86,0) 20(22.86,-7.62) 21(25.4,0) 22(25.4,-7.62) 23(27.94,0) 24(27.94,-7.62) 25(30.48,0) 26(30.48,-7.62) 27(33.02,0) 28(33.02,-7.62) 29(35.56,0) 30(35.56,-7.62) 31(38.1,0) 32(38.1,-7.62) 33(40.64,0) 34(40.64,-7.62) 35(43.18,0) 36(43.18,-7.62) 37(45.72,0) 38(45.72,-7.62) 39(48.26,0) 40(48.26,-7.62) 41(50.8,0) 42(50.8,-7.62) 43(53.34,0) 44(53.34,-7.62) 45(55.88,0) 46(55.88,-7.62) 47(58.42,0) 48(58.42,-7.62) 49(60.96,0) 50(60.96,-7.62) 51(63.5,0) 52(63.5,-7.62) 53(66.04,0) 54(66.04,-7.62) 55(68.58,0) 56(68.58,-7.62) 57(71.12,0) 58(71.12,-7.62) 59(73.66,0) 60(73.66,-7.62) 61(76.2,0) 62(76.2,-7.62) 63(78.74,0) 64(78.74,-7.62) 65(81.28,0) 66(81.28,-7.62) 67(83.82,0) 68(83.82,-7.62)
  round 1.4 hole 1.4: Un1(7.62,-2.54) Un2(66.04,-2.54) Un3(25.4,-5.08) Un4(68.58,-5.08) Un5(60.96,-5.08) Un6(12.7,-5.08) Un7(78.74,-5.08) Un8(15.24,-5.08) Un9(25.4,-2.54) Un10(33.02,-2.54) Un11(0,-5.08) Un12(40.64,-2.54) Un13(22.86,-2.54) Un14(76.2,-5.08) Un15(35.56,-5.08) Un16(27.94,-2.54) Un17(35.56,-2.54) Un18(15.24,-2.54) Un19(45.72,-5.08) Un20(58.42,-2.54) Un21(83.82,-5.08) Un22(5.08,-5.08) Un23(22.86,-5.08) Un24(38.1,-5.08) Un25(27.94,-5.08) Un26(2.54,-5.08) Un27(5.08,-2.54) Un28(53.34,-2.54) Un29(76.2,-2.54) Un30(20.32,-2.54) Un31(60.96,-2.54) Un32(50.8,-5.08) Un33(17.78,-5.08) Un34(33.02,-5.08) Un35(81.28,-5.08) Un36(43.18,-5.08) Un37(48.26,-5.08) Un38(63.5,-5.08) Un39(55.88,-5.08) Un40(10.16,-5.08) Un41(45.72,-2.54) Un42(10.16,-2.54) Un43(66.04,-5.08) Un44(17.78,-2.54) Un45(71.12,-2.54) Un46(73.66,-5.08) Un47(68.58,-2.54) Un48(78.74,-2.54) Un49(7.62,-5.08) Un50(55.88,-2.54) Un51(71.12,-5.08) Un52(53.34,-5.08) Un53(30.48,-2.54) Un54(30.48,-5.08) Un55(38.1,-2.54) Un56(40.64,-5.08) Un57(58.42,-5.08) Un58(0,-2.54) Un59(20.32,-5.08) Un60(12.7,-2.54) Un61(73.66,-2.54) Un62(81.28,-2.54) Un63(43.18,-2.54) Un64(63.5,-2.54) Un65(48.26,-2.54) Un66(83.82,-2.54) Un67(2.54,-2.54) Un68(50.8,-2.54)
F.SilkS:
  lines w0.12: -1.38,-6.46 85.2,-6.46 85.2,-1.16 -1.38,-1.16 -1.38,-6.46
F.CrtYd:
  lines w0.05: -1.77,-8.78 85.59,-8.78 85.59,1.16 -1.77,1.16 -1.77,-8.78
F.Fab:
  lines w0.1: -0.5,-1.27 0,-1.977 0.5,-1.27 ; -1.27,-6.35 -1.27,-1.27 85.09,-1.27 85.09,-6.35 -1.27,-6.35
  text "'.Designator'" at 37.863,-6.49 h1

## Samtec_HLE-134-02-xx-DV-TE_2x34_P2.54mm_Horizontal [mm]
pads (68):
  rrect19% 1.31x1.31 hole 0.71: 1(0,0)
  round 1.31 hole 0.71: 2(0,-2.54) 3(2.54,0) 4(2.54,-2.54) 5(5.08,0) 6(5.08,-2.54) 7(7.62,0) 8(7.62,-2.54) 9(10.16,0) 10(10.16,-2.54) 11(12.7,0) 12(12.7,-2.54) 13(15.24,0) 14(15.24,-2.54) 15(17.78,0) 16(17.78,-2.54) 17(20.32,0) 18(20.32,-2.54) 19(22.86,0) 20(22.86,-2.54) 21(25.4,0) 22(25.4,-2.54) 23(27.94,0) 24(27.94,-2.54) 25(30.48,0) 26(30.48,-2.54) 27(33.02,0) 28(33.02,-2.54) 29(35.56,0) 30(35.56,-2.54) 31(38.1,0) 32(38.1,-2.54) 33(40.64,0) 34(40.64,-2.54) 35(43.18,0) 36(43.18,-2.54) 37(45.72,0) 38(45.72,-2.54) 39(48.26,0) 40(48.26,-2.54) 41(50.8,0) 42(50.8,-2.54) 43(53.34,0) 44(53.34,-2.54) 45(55.88,0) 46(55.88,-2.54) 47(58.42,0) 48(58.42,-2.54) 49(60.96,0) 50(60.96,-2.54) 51(63.5,0) 52(63.5,-2.54) 53(66.04,0) 54(66.04,-2.54) 55(68.58,0) 56(68.58,-2.54) 57(71.12,0) 58(71.12,-2.54) 59(73.66,0) 60(73.66,-2.54) 61(76.2,0) 62(76.2,-2.54) 63(78.74,0) 64(78.74,-2.54) 65(81.28,0) 66(81.28,-2.54) 67(83.82,0) 68(83.82,-2.54)
F.SilkS:
  lines w0.12: -1.38,-3.92 85.2,-3.92 85.2,1.38 -1.38,1.38 -1.38,-3.92
F.CrtYd:
  lines w0.05: -1.77,-4.31 -1.77,1.77 85.59,1.77 85.59,-4.31 -1.77,-4.31
F.Fab:
  lines w0.1: -0.5,1.27 0,0.563 0.5,1.27 ; -1.27,-3.81 -1.27,1.27 85.09,1.27 85.09,-3.81 -1.27,-3.81
  text "'.Designator'" at 37.863,-3.95 h1

## Samtec_HLE-135-02-xx-DV-PE-LC_2x35_P2.54mm_Horizontal [mm]
pads (142):
  rrect19% 1.31x1.31 hole 0.71: 1(0,0)
  round 1.31 hole 0.71: 2(0,-7.62) 3(2.54,0) 4(2.54,-7.62) 5(5.08,0) 6(5.08,-7.62) 7(7.62,0) 8(7.62,-7.62) 9(10.16,0) 10(10.16,-7.62) 11(12.7,0) 12(12.7,-7.62) 13(15.24,0) 14(15.24,-7.62) 15(17.78,0) 16(17.78,-7.62) 17(20.32,0) 18(20.32,-7.62) 19(22.86,0) 20(22.86,-7.62) 21(25.4,0) 22(25.4,-7.62) 23(27.94,0) 24(27.94,-7.62) 25(30.48,0) 26(30.48,-7.62) 27(33.02,0) 28(33.02,-7.62) 29(35.56,0) 30(35.56,-7.62) 31(38.1,0) 32(38.1,-7.62) 33(40.64,0) 34(40.64,-7.62) 35(43.18,0) 36(43.18,-7.62) 37(45.72,0) 38(45.72,-7.62) 39(48.26,0) 40(48.26,-7.62) 41(50.8,0) 42(50.8,-7.62) 43(53.34,0) 44(53.34,-7.62) 45(55.88,0) 46(55.88,-7.62) 47(58.42,0) 48(58.42,-7.62) 49(60.96,0) 50(60.96,-7.62) 51(63.5,0) 52(63.5,-7.62) 53(66.04,0) 54(66.04,-7.62) 55(68.58,0) 56(68.58,-7.62) 57(71.12,0) 58(71.12,-7.62) 59(73.66,0) 60(73.66,-7.62) 61(76.2,0) 62(76.2,-7.62) 63(78.74,0) 64(78.74,-7.62) 65(81.28,0) 66(81.28,-7.62) 67(83.82,0) 68(83.82,-7.62) 69(86.36,0) 70(86.36,-7.62)
  round 1.4 hole 1.4: Un1(58.42,-5.08) Un2(30.48,-5.08) Un3(27.94,-5.08) Un4(22.86,-2.54) Un5(45.72,-2.54) Un6(2.54,-2.54) Un7(10.16,-5.08) Un8(25.4,-5.08) Un9(35.56,-5.08) Un10(10.16,-2.54) Un11(78.74,-5.08) Un12(55.88,-5.08) Un13(22.86,-5.08) Un14(60.96,-5.08) Un15(33.02,-5.08) Un16(76.2,-2.54) Un17(17.78,-5.08) Un18(35.56,-2.54) Un19(68.58,-5.08) Un20(50.8,-5.08) Un22(58.42,-2.54) Un23(12.7,-2.54) Un24(27.94,-2.54) Un25(43.18,-2.54) Un26(15.24,-2.54) Un27(38.1,-2.54) Un28(5.08,-5.08) Un29(53.34,-5.08) Un30(66.04,-5.08) Un31(40.64,-5.08) Un32(15.24,-5.08) Un33(40.64,-2.54) Un34(81.28,-5.08) Un35(17.78,-2.54) Un36(63.5,-5.08) Un37(86.36,-5.08) Un38(12.7,-5.08) Un39(66.04,-2.54) Un40(83.82,-5.08) Un41(2.54,-5.08) Un42(48.26,-2.54) Un43(30.48,-2.54) Un44(38.1,-5.08) Un45(76.2,-5.08) Un46(0,-2.54) Un47(20.32,-5.08) Un48(60.96,-2.54) Un49(71.12,-5.08) Un50(63.5,-2.54) Un51(55.88,-2.54) Un52(86.36,-2.54) Un53(73.66,-2.54) Un54(5.08,-2.54) Un55(68.58,-2.54) Un56(0,-5.08) Un57(33.02,-2.54) Un58(73.66,-5.08) Un59(45.72,-5.08) Un60(48.26,-5.08) Un61(7.62,-5.08) Un62(78.74,-2.54) Un63(50.8,-2.54) Un64(71.12,-2.54) Un65(25.4,-2.54) Un66(83.82,-2.54) Un67(20.32,-2.54) Un68(7.62,-2.54) Un69(81.28,-2.54) Un70(53.34,-2.54) Un71(43.18,-5.08)
  round 1.19 hole 1.19: Un21(85.09,-3.81) Un72(1.27,-3.81)
F.SilkS:
  lines w0.12: -1.38,-6.46 -1.38,-1.16 87.74,-1.16 87.74,-6.46 -1.38,-6.46
F.CrtYd:
  lines w0.05: -1.77,-8.78 88.13,-8.78 88.13,1.16 -1.77,1.16 -1.77,-8.78
F.Fab:
  lines w0.1: -0.5,-1.27 0,-1.977 0.5,-1.27 ; -1.27,-6.35 -1.27,-1.27 87.63,-1.27 87.63,-6.35 -1.27,-6.35
  text "'.Designator'" at 39.133,-6.49 h1

## Samtec_HLE-135-02-xx-DV-PE_2x35_P2.54mm_Horizontal [mm]
pads (140):
  rrect19% 1.31x1.31 hole 0.71: 1(0,0)
  round 1.31 hole 0.71: 2(0,-7.62) 3(2.54,0) 4(2.54,-7.62) 5(5.08,0) 6(5.08,-7.62) 7(7.62,0) 8(7.62,-7.62) 9(10.16,0) 10(10.16,-7.62) 11(12.7,0) 12(12.7,-7.62) 13(15.24,0) 14(15.24,-7.62) 15(17.78,0) 16(17.78,-7.62) 17(20.32,0) 18(20.32,-7.62) 19(22.86,0) 20(22.86,-7.62) 21(25.4,0) 22(25.4,-7.62) 23(27.94,0) 24(27.94,-7.62) 25(30.48,0) 26(30.48,-7.62) 27(33.02,0) 28(33.02,-7.62) 29(35.56,0) 30(35.56,-7.62) 31(38.1,0) 32(38.1,-7.62) 33(40.64,0) 34(40.64,-7.62) 35(43.18,0) 36(43.18,-7.62) 37(45.72,0) 38(45.72,-7.62) 39(48.26,0) 40(48.26,-7.62) 41(50.8,0) 42(50.8,-7.62) 43(53.34,0) 44(53.34,-7.62) 45(55.88,0) 46(55.88,-7.62) 47(58.42,0) 48(58.42,-7.62) 49(60.96,0) 50(60.96,-7.62) 51(63.5,0) 52(63.5,-7.62) 53(66.04,0) 54(66.04,-7.62) 55(68.58,0) 56(68.58,-7.62) 57(71.12,0) 58(71.12,-7.62) 59(73.66,0) 60(73.66,-7.62) 61(76.2,0) 62(76.2,-7.62) 63(78.74,0) 64(78.74,-7.62) 65(81.28,0) 66(81.28,-7.62) 67(83.82,0) 68(83.82,-7.62) 69(86.36,0) 70(86.36,-7.62)
  round 1.4 hole 1.4: Un1(48.26,-2.54) Un2(78.74,-2.54) Un3(10.16,-5.08) Un4(33.02,-2.54) Un5(7.62,-2.54) Un6(60.96,-5.08) Un7(12.7,-2.54) Un8(60.96,-2.54) Un9(15.24,-5.08) Un10(5.08,-2.54) Un11(71.12,-2.54) Un12(63.5,-2.54) Un13(15.24,-2.54) Un14(83.82,-5.08) Un15(68.58,-2.54) Un16(40.64,-5.08) Un17(25.4,-2.54) Un18(45.72,-2.54) Un19(53.34,-2.54) Un20(86.36,-2.54) Un21(38.1,-5.08) Un22(63.5,-5.08) Un23(43.18,-2.54) Un24(33.02,-5.08) Un25(81.28,-5.08) Un26(7.62,-5.08) Un27(73.66,-5.08) Un28(71.12,-5.08) Un29(50.8,-5.08) Un30(27.94,-5.08) Un31(25.4,-5.08) Un32(0,-2.54) Un33(76.2,-2.54) Un34(73.66,-2.54) Un35(22.86,-2.54) Un36(30.48,-5.08) Un37(35.56,-2.54) Un38(22.86,-5.08) Un39(2.54,-5.08) Un40(5.08,-5.08) Un41(43.18,-5.08) Un42(17.78,-5.08) Un43(35.56,-5.08) Un44(76.2,-5.08) Un45(58.42,-5.08) Un46(58.42,-2.54) Un47(10.16,-2.54) Un48(50.8,-2.54) Un49(40.64,-2.54) Un50(48.26,-5.08) Un51(66.04,-5.08) Un52(20.32,-5.08) Un53(45.72,-5.08) Un54(53.34,-5.08) Un55(27.94,-2.54) Un56(83.82,-2.54) Un57(86.36,-5.08) Un58(0,-5.08) Un59(78.74,-5.08) Un60(55.88,-2.54) Un61(66.04,-2.54) Un62(68.58,-5.08) Un63(30.48,-2.54) Un64(55.88,-5.08) Un65(17.78,-2.54) Un66(12.7,-5.08) Un67(2.54,-2.54) Un68(38.1,-2.54) Un69(81.28,-2.54) Un70(20.32,-2.54)
F.SilkS:
  lines w0.12: -1.38,-6.46 87.74,-6.46 87.74,-1.16 -1.38,-1.16 -1.38,-6.46
F.CrtYd:
  lines w0.05: -1.77,-8.78 88.13,-8.78 88.13,1.16 -1.77,1.16 -1.77,-8.78
F.Fab:
  lines w0.1: -0.5,-1.27 0,-1.977 0.5,-1.27 ; -1.27,-6.35 87.63,-6.35 87.63,-1.27 -1.27,-1.27 -1.27,-6.35
  text "'.Designator'" at 39.133,-6.49 h1

## Samtec_HLE-135-02-xx-DV-TE_2x35_P2.54mm_Horizontal [mm]
pads (70):
  rrect19% 1.31x1.31 hole 0.71: 1(0,0)
  round 1.31 hole 0.71: 2(0,-2.54) 3(2.54,0) 4(2.54,-2.54) 5(5.08,0) 6(5.08,-2.54) 7(7.62,0) 8(7.62,-2.54) 9(10.16,0) 10(10.16,-2.54) 11(12.7,0) 12(12.7,-2.54) 13(15.24,0) 14(15.24,-2.54) 15(17.78,0) 16(17.78,-2.54) 17(20.32,0) 18(20.32,-2.54) 19(22.86,0) 20(22.86,-2.54) 21(25.4,0) 22(25.4,-2.54) 23(27.94,0) 24(27.94,-2.54) 25(30.48,0) 26(30.48,-2.54) 27(33.02,0) 28(33.02,-2.54) 29(35.56,0) 30(35.56,-2.54) 31(38.1,0) 32(38.1,-2.54) 33(40.64,0) 34(40.64,-2.54) 35(43.18,0) 36(43.18,-2.54) 37(45.72,0) 38(45.72,-2.54) 39(48.26,0) 40(48.26,-2.54) 41(50.8,0) 42(50.8,-2.54) 43(53.34,0) 44(53.34,-2.54) 45(55.88,0) 46(55.88,-2.54) 47(58.42,0) 48(58.42,-2.54) 49(60.96,0) 50(60.96,-2.54) 51(63.5,0) 52(63.5,-2.54) 53(66.04,0) 54(66.04,-2.54) 55(68.58,0) 56(68.58,-2.54) 57(71.12,0) 58(71.12,-2.54) 59(73.66,0) 60(73.66,-2.54) 61(76.2,0) 62(76.2,-2.54) 63(78.74,0) 64(78.74,-2.54) 65(81.28,0) 66(81.28,-2.54) 67(83.82,0) 68(83.82,-2.54) 69(86.36,0) 70(86.36,-2.54)
F.SilkS:
  lines w0.12: -1.38,-3.92 87.74,-3.92 87.74,1.38 -1.38,1.38 -1.38,-3.92
F.CrtYd:
  lines w0.05: -1.77,-4.31 88.13,-4.31 88.13,1.77 -1.77,1.77 -1.77,-4.31
F.Fab:
  lines w0.1: -0.5,1.27 0,0.563 0.5,1.27 ; -1.27,-3.81 -1.27,1.27 87.63,1.27 87.63,-3.81 -1.27,-3.81
  text "'.Designator'" at 39.133,-3.95 h1